# Altium footprint library hphonglib.PcbLib: 1250 footprints (part 20 of 79)
Each footprint in its own frame and in the unit in brackets; x right, y up, seen from the top. Pads: shape width x height; smd on the part's side, far side on the other; paste and mask are expansions set on the pad; w line width, h text height; cw(c..) or ccw(c..) is an arc to the next point about the centre after c.
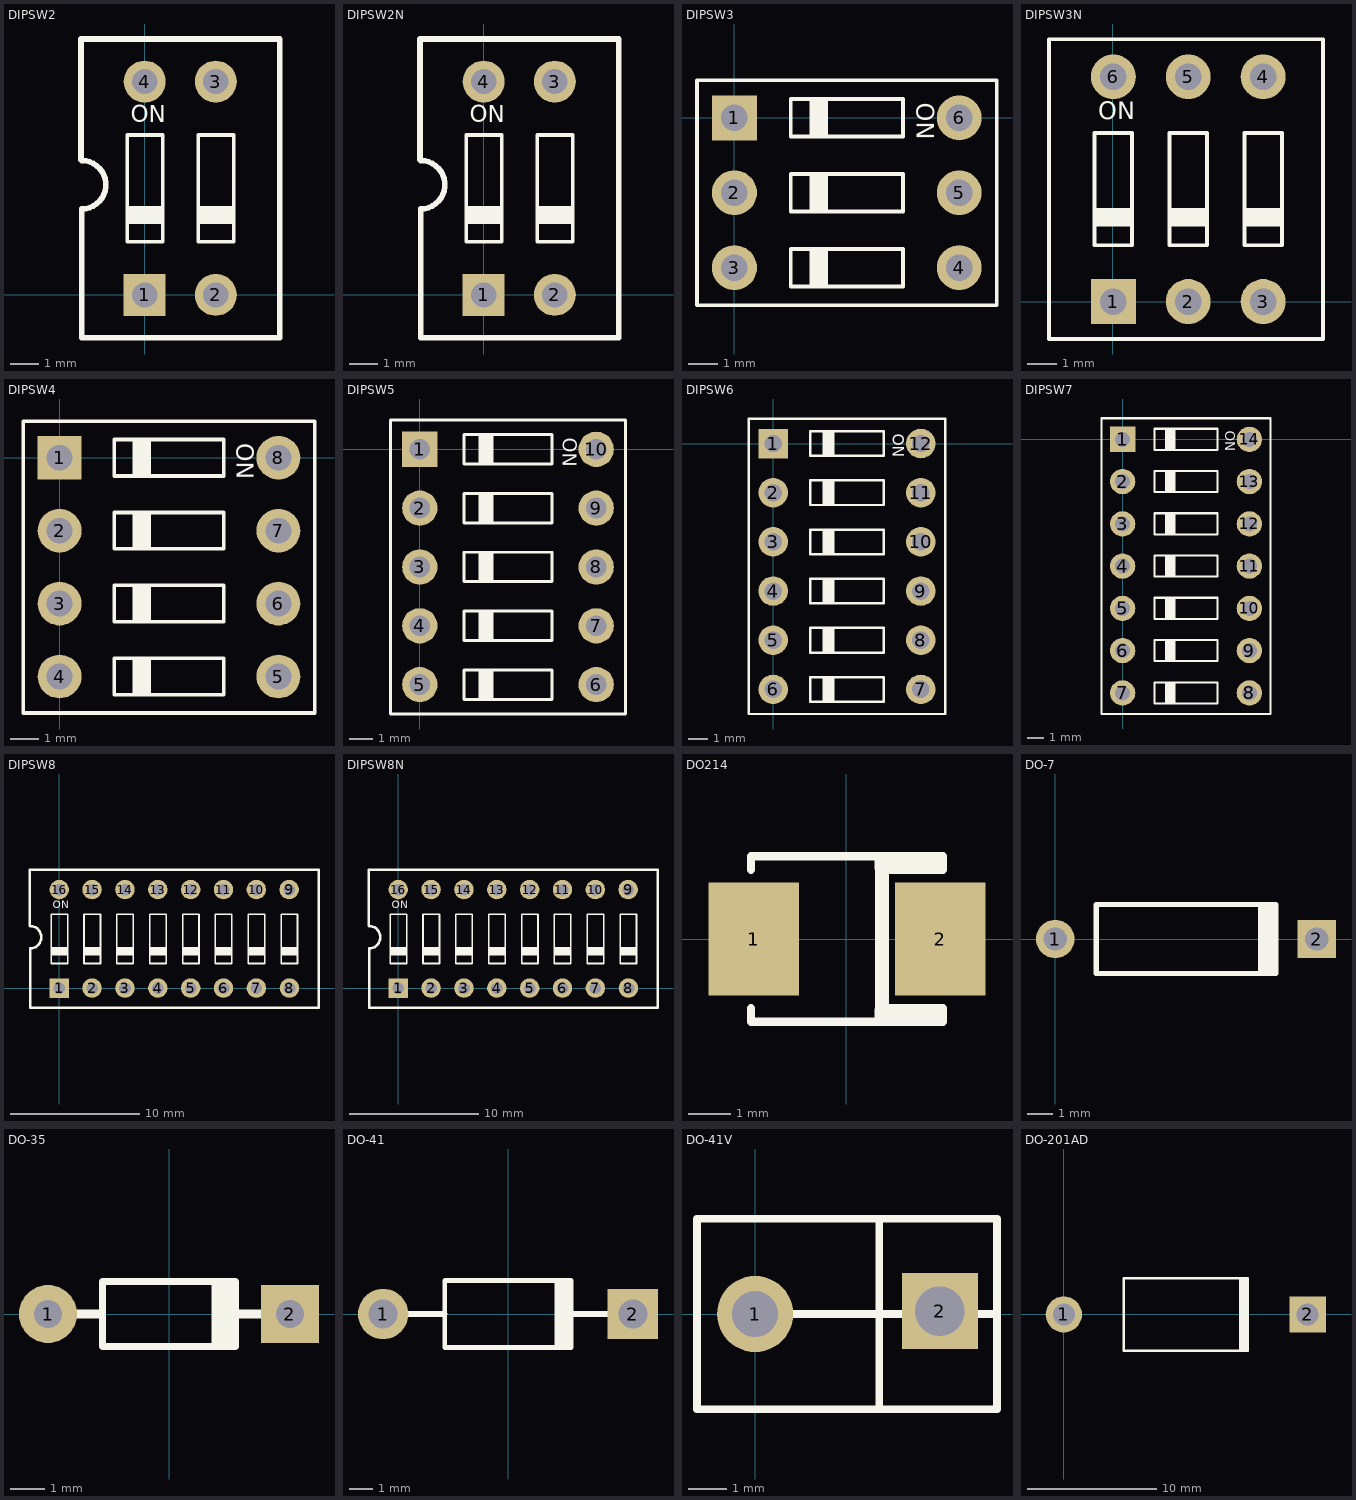
[diagram p19: the footprints below, top view; thin cyan lines are the x and y axes]

## DIPSW2 [mm]
pads (4):
  rect 1.5x1.5 hole 0.9: 1(0,0)
  round 1.5 hole 0.9: 2(2.54,0) 3(2.54,7.62) 4(0,7.62)
Top Overlay:
  region: 3.186,2.539 3.186,3.174 1.916,3.174 1.916,2.539
  region: 0.646,2.539 0.646,3.174 -0.624,3.174 -0.624,2.539
  lines w0.127: -0.624,1.904 -0.624,5.714 0.646,5.714 0.646,1.904 -0.624,1.904 ; 1.916,1.904 1.916,5.714 3.186,5.714 3.186,1.904 1.916,1.904
  lines w0.2: -2.275,4.825 -2.275,9.143 4.829,9.143 4.829,-1.525 -2.249,-1.525 -2.249,3.072 ccw(c-2.249,3.936) -2.249,4.799
  text "ON" at -0.497,5.968 h1.02
Bottom Overlay:
  lines w0.254: -2.275,-1.575 -2.275,9.125 4.85,9.125 4.85,-1.575 -2.275,-1.575
3D body: height 3.2, standoff 0.03, extent -0.311,7.314 0.299,7.924
3D body: height 3.2, standoff 0.03, extent 2.229,7.314 2.839,7.924
3D body: height 3.2, standoff 0.03, extent 2.229,-0.306 2.839,0.304
3D body: height 3.2, standoff 0.03, extent -0.285,-0.306 0.324,0.304
3D body: height 5.9, standoff 0.01, extent -2.021,-1.271 4.557,8.889
3D body: height 7.11, standoff 0.03, extent -0.497,4.063 0.519,6.095
3D body: height 6.48, standoff 0.03, extent -0.497,1.523 0.519,4.063
3D body: height 6.48, standoff 0.03, extent 2.043,3.555 3.059,6.095
3D body: height 7.11, standoff 0.03, extent 2.043,1.523 3.059,3.555

## DIPSW2N [mm]
pads (4):
  rect 1.5x1.5 hole 0.9: 1(0,0)
  round 1.5 hole 0.9: 2(2.54,0) 3(2.54,7.62) 4(0,7.62)
Top Overlay:
  region: 0.646,2.539 0.646,3.174 -0.624,3.174 -0.624,2.539
  region: 3.186,2.539 3.186,3.174 1.916,3.174 1.916,2.539
  lines w0.127: -0.624,1.904 0.646,1.904 0.646,5.714 -0.624,5.714 -0.624,1.904 ; 1.916,1.904 3.186,1.904 3.186,5.714 1.916,5.714 1.916,1.904
  lines w0.2: -2.275,4.825 -2.275,9.143 4.829,9.143 4.829,-1.525 -2.249,-1.525 -2.249,3.072 ccw(c-2.249,3.936) -2.249,4.799
  text "ON" at -0.497,5.968 h1.02
Bottom Overlay:
  lines w0.254: -2.275,-1.575 4.85,-1.575 4.85,9.125 -2.275,9.125 -2.275,-1.575

## DIPSW3 [mil]
pads (6):
  rect 60x60 hole 35.43 unplated: 1(0,0)
  round 60 hole 35.43 unplated: 2(0,-100) 3(0,-200) 4(300,-200) 5(300,-100) 6(300,0)
Top Overlay:
  rectangle: 100,-25 125,25
  rectangle: 100,-125 125,-75
  rectangle: 100,-225 125,-175
  lines w5: -50,-250 350,-250 350,50 -50,50 -50,-250 ; 75,-225 75,-175 225,-175 225,-225 75,-225 ; 75,-125 75,-75 225,-75 225,-125 75,-125 ; 75,-25 75,25 225,25 225,-25 75,-25
  text "ON" at 235,20 h40
Bottom Overlay:
  lines w10: -49.21,-249.02 -49.21,50.2 350.39,50.2 350.39,-249.02 -49.21,-249.02

## DIPSW3N [mil]
pads (6):
  rect 60x60 hole 35.43 unplated: 1(1,0)
  round 60 hole 35.43 unplated: 2(101,0) 3(201,0) 4(201,300) 5(101,300) 6(1,300)
Top Overlay:
  region: 26,100 26,125 -24,125 -24,100
  region: 126,100 126,125 76,125 76,100
  region: 226,100 226,125 176,125 176,100
  lines w5: -85,-50 -85,350 281,350 281,-50 -85,-50 ; -24,75 26,75 26,225 -24,225 -24,75 ; 76,75 126,75 126,225 76,225 76,75 ; 176,75 226,75 226,225 176,225 176,75
  text "ON" at -19,235 h40
Bottom Overlay:
  lines w10: -86,-49.21 282,-49.21 282,350.39 -86,350.39 -86,-49.21
3D body "DIPSWITCH.STEP": height 271.65, standoff -125.98, extent -79.92,-49 279.92,351

## DIPSW4 [mil]
pads (8):
  rect 60x60 hole 35.43 unplated: 1(0,0)
  round 60 hole 35.43 unplated: 2(0,-100) 3(0,-200) 4(0,-300) 5(300,-300) 6(300,-200) 7(300,-100) 8(300,0)
Top Overlay:
  rectangle: 100,-325 125,-275
  rectangle: 100,-225 125,-175
  rectangle: 100,-125 125,-75
  rectangle: 100,-25 125,25
  lines w5: -50,-350 -50,50 350,50 350,-350 -50,-350 ; 75,-325 225,-325 225,-275 75,-275 75,-325 ; 75,-225 225,-225 225,-175 75,-175 75,-225 ; 75,-125 225,-125 225,-75 75,-75 75,-125 ; 75,-25 225,-25 225,25 75,25 75,-25
  text "ON" at 235,20 h40
Bottom Overlay:
  lines w10: -48.23,-351.38 349.41,-351.38 349.41,49.21 -48.23,49.21 -48.23,-351.38
3D body "DIPSWITCH4.STEP": height 271.65, standoff -125.98, extent -15.92,-352 343.92,48

## DIPSW5 [mil]
pads (10):
  rect 60x60 hole 35.43 unplated: 1(0,0)
  round 60 hole 35.43 unplated: 2(0,-100) 3(0,-200) 4(0,-300) 5(0,-400) 6(300,-400) 7(300,-300) 8(300,-200) 9(300,-100) 10(300,0)
Top Overlay:
  rectangle: 100,-25 125,25
  rectangle: 100,-125 125,-75
  rectangle: 100,-225 125,-175
  rectangle: 100,-325 125,-275
  rectangle: 100,-425 125,-375
  lines w5: -50,-450 350,-450 350,50 -50,50 -50,-450 ; 75,-425 75,-375 225,-375 225,-425 75,-425 ; 75,-325 75,-275 225,-275 225,-325 75,-325 ; 75,-225 75,-175 225,-175 225,-225 75,-225 ; 75,-125 75,-75 225,-75 225,-125 75,-125 ; 75,-25 75,25 225,25 225,-25 75,-25
  text "ON" at 235,20 h40

## DIPSW6 [mil]
pads (12):
  rect 60x60 hole 35.43 unplated: 1(0,0)
  round 60 hole 35.43 unplated: 2(0,-100) 3(0,-200) 4(0,-300) 5(0,-400) 6(0,-500) 7(300,-500) 8(300,-400) 9(300,-300) 10(300,-200) 11(300,-100) 12(300,0)
Top Overlay:
  rectangle: 100,-525 125,-475
  rectangle: 100,-425 125,-375
  rectangle: 100,-325 125,-275
  rectangle: 100,-225 125,-175
  rectangle: 100,-125 125,-75
  rectangle: 100,-25 125,25
  lines w5: -50,-550 -50,50 350,50 350,-550 -50,-550 ; 75,-525 225,-525 225,-475 75,-475 75,-525 ; 75,-425 225,-425 225,-375 75,-375 75,-425 ; 75,-325 225,-325 225,-275 75,-275 75,-325 ; 75,-225 225,-225 225,-175 75,-175 75,-225 ; 75,-125 225,-125 225,-75 75,-75 75,-125 ; 75,-25 225,-25 225,25 75,25 75,-25
  text "ON" at 235,20 h40

## DIPSW7 [mil]
pads (14):
  rect 60x60 hole 35.43 unplated: 1(0,0)
  round 60 hole 35.43 unplated: 2(0,-100) 3(0,-200) 4(0,-300) 5(0,-400) 6(0,-500) 7(0,-600) 8(300,-600) 9(300,-500) 10(300,-400) 11(300,-300) 12(300,-200) 13(300,-100) 14(300,0)
Top Overlay:
  rectangle: 100,-25 125,25
  rectangle: 100,-125 125,-75
  rectangle: 100,-225 125,-175
  rectangle: 100,-325 125,-275
  rectangle: 100,-425 125,-375
  rectangle: 100,-525 125,-475
  rectangle: 100,-625 125,-575
  lines w5: -50,-650 350,-650 350,50 -50,50 -50,-650 ; 75,-625 75,-575 225,-575 225,-625 75,-625 ; 75,-525 75,-475 225,-475 225,-525 75,-525 ; 75,-425 75,-375 225,-375 225,-425 75,-425 ; 75,-325 75,-275 225,-275 225,-325 75,-325 ; 75,-225 75,-175 225,-175 225,-225 75,-225 ; 75,-125 75,-75 225,-75 225,-125 75,-125 ; 75,-25 75,25 225,25 225,-25 75,-25
  text "ON" at 235,20 h40

## DIPSW8 [mm] "DIPS SWITCHES 8"
pads (16):
  rect 1.5x1.5 hole 0.9: 1(-0.011,0.001)
  round 1.5 hole 0.9: 2(2.529,0.001) 3(5.069,0.001) 4(7.609,0.001) 5(10.149,0.001) 6(12.689,0.001) 7(15.229,0.001) 8(17.789,0.001) 9(17.769,7.621) 10(15.229,7.621) 11(12.689,7.621) 12(10.149,7.621) 13(7.609,7.621) 14(5.069,7.621) 15(2.529,7.621) 16(-0.011,7.621)
Top Overlay:
  region: 18.415,2.54 18.415,3.175 17.145,3.175 17.145,2.54
  region: 15.875,2.54 15.875,3.175 14.605,3.175 14.605,2.54
  region: 13.335,2.54 13.335,3.175 12.065,3.175 12.065,2.54
  region: 10.795,2.54 10.795,3.175 9.525,3.175 9.525,2.54
  region: 8.255,2.54 8.255,3.175 6.985,3.175 6.985,2.54
  region: 5.715,2.54 5.715,3.175 4.445,3.175 4.445,2.54
  region: 3.175,2.54 3.175,3.175 1.905,3.175 1.905,2.54
  region: 0.635,2.54 0.635,3.175 -0.635,3.175 -0.635,2.54
  lines w0.127: -0.635,1.905 -0.635,5.715 0.635,5.715 0.635,1.905 -0.635,1.905 ; 1.905,1.905 1.905,5.715 3.175,5.715 3.175,1.905 1.905,1.905 ; 4.445,1.905 4.445,5.715 5.715,5.715 5.715,1.905 4.445,1.905 ; 6.985,1.905 6.985,5.715 8.255,5.715 8.255,1.905 6.985,1.905 ; 9.525,1.905 9.525,5.715 10.795,5.715 10.795,1.905 9.525,1.905 ; 12.065,1.905 12.065,5.715 13.335,5.715 13.335,1.905 12.065,1.905 ; 14.605,1.905 14.605,5.715 15.875,5.715 15.875,1.905 14.605,1.905 ; 17.145,1.905 17.145,5.715 18.415,5.715 18.415,1.905 17.145,1.905
  lines w0.2: -2.286,4.826 -2.286,9.144 20.066,9.144 20.066,-1.524 -2.261,-1.524 -2.261,3.073 ccw(c-2.261,3.937) -2.261,4.801
  text "ON" at -0.508,5.969 h1.02
Bottom Overlay:
  lines w0.254: -2.2,-1.55 20.075,-1.55 20.075,9.15 -2.2,9.15 -2.2,-1.55
3D body: height 3.2, standoff 0.03, extent -0.322,7.316 0.288,7.925
3D body: height 3.2, standoff 0.03, extent 2.218,7.316 2.828,7.925
3D body: height 3.2, standoff 0.03, extent 4.758,7.316 5.368,7.925
3D body: height 3.2, standoff 0.03, extent 7.298,7.316 7.908,7.925
3D body: height 3.2, standoff 0.03, extent 9.838,7.316 10.448,7.925
3D body: height 3.2, standoff 0.03, extent 12.378,7.316 12.988,7.925
3D body: height 3.2, standoff 0.03, extent 14.918,7.316 15.528,7.925
3D body: height 3.2, standoff 0.03, extent 17.458,7.316 18.068,7.925
3D body: height 3.2, standoff 0.03, extent 17.484,-0.304 18.093,0.305
3D body: height 3.2, standoff 0.03, extent 14.918,-0.304 15.528,0.305
3D body: height 3.2, standoff 0.03, extent 12.378,-0.304 12.988,0.305
3D body: height 3.2, standoff 0.03, extent 9.838,-0.304 10.448,0.305
3D body: height 3.2, standoff 0.03, extent 7.298,-0.304 7.908,0.305
3D body: height 3.2, standoff 0.03, extent 4.758,-0.304 5.368,0.305
3D body: height 3.2, standoff 0.03, extent 2.218,-0.304 2.828,0.305
3D body: height 3.2, standoff 0.03, extent -0.296,-0.304 0.313,0.305
3D body: height 5.9, standoff 0.01, extent -2.032,-1.27 19.812,8.89
3D body: height 7.11, standoff 0.03, extent -0.508,4.064 0.508,6.096
3D body: height 6.48, standoff 0.03, extent -0.508,1.524 0.508,4.064
3D body: height 6.48, standoff 0.03, extent 4.572,1.524 5.588,4.064
3D body: height 7.11, standoff 0.03, extent 4.572,4.064 5.588,6.096
3D body: height 6.48, standoff 0.03, extent 7.112,1.524 8.128,4.064
3D body: height 7.11, standoff 0.03, extent 7.112,4.064 8.128,6.096
3D body: height 6.48, standoff 0.03, extent 14.732,1.524 15.748,4.064
3D body: height 7.11, standoff 0.03, extent 14.732,4.064 15.748,6.096
3D body: height 6.48, standoff 0.03, extent 2.032,3.556 3.048,6.096
3D body: height 7.11, standoff 0.03, extent 2.032,1.524 3.048,3.556
3D body: height 6.48, standoff 0.03, extent 9.652,3.556 10.668,6.096
3D body: height 7.11, standoff 0.03, extent 9.652,1.524 10.668,3.556
3D body: height 6.48, standoff 0.03, extent 12.192,3.556 13.208,6.096
3D body: height 7.11, standoff 0.03, extent 12.192,1.524 13.208,3.556
3D body: height 6.48, standoff 0.03, extent 17.272,3.556 18.288,6.096
3D body: height 7.11, standoff 0.03, extent 17.272,1.524 18.288,3.556

## DIPSW8N [mm] "DIPS SWITCHES 8"
pads (16):
  rect 1.5x1.5 hole 0.9: 1(-0.011,0.001)
  round 1.5 hole 0.9: 2(2.529,0.001) 3(5.069,0.001) 4(7.609,0.001) 5(10.149,0.001) 6(12.689,0.001) 7(15.229,0.001) 8(17.789,0.001) 9(17.769,7.621) 10(15.229,7.621) 11(12.689,7.621) 12(10.149,7.621) 13(7.609,7.621) 14(5.069,7.621) 15(2.529,7.621) 16(-0.011,7.621)
Top Overlay:
  region: 18.415,2.54 18.415,3.175 17.145,3.175 17.145,2.54
  region: 15.875,2.54 15.875,3.175 14.605,3.175 14.605,2.54
  region: 13.335,2.54 13.335,3.175 12.065,3.175 12.065,2.54
  region: 10.795,2.54 10.795,3.175 9.525,3.175 9.525,2.54
  region: 8.255,2.54 8.255,3.175 6.985,3.175 6.985,2.54
  region: 5.715,2.54 5.715,3.175 4.445,3.175 4.445,2.54
  region: 3.175,2.54 3.175,3.175 1.905,3.175 1.905,2.54
  region: 0.635,2.54 0.635,3.175 -0.635,3.175 -0.635,2.54
  lines w0.127: -0.635,1.905 -0.635,5.715 0.635,5.715 0.635,1.905 -0.635,1.905 ; 1.905,1.905 1.905,5.715 3.175,5.715 3.175,1.905 1.905,1.905 ; 4.445,1.905 4.445,5.715 5.715,5.715 5.715,1.905 4.445,1.905 ; 6.985,1.905 6.985,5.715 8.255,5.715 8.255,1.905 6.985,1.905 ; 9.525,1.905 9.525,5.715 10.795,5.715 10.795,1.905 9.525,1.905 ; 12.065,1.905 12.065,5.715 13.335,5.715 13.335,1.905 12.065,1.905 ; 14.605,1.905 14.605,5.715 15.875,5.715 15.875,1.905 14.605,1.905 ; 17.145,1.905 17.145,5.715 18.415,5.715 18.415,1.905 17.145,1.905
  lines w0.2: -2.286,4.826 -2.286,9.144 20.066,9.144 20.066,-1.524 -2.261,-1.524 -2.261,3.073 ccw(c-2.261,3.937) -2.261,4.801
  text "ON" at -0.508,5.969 h1.02
Bottom Overlay:
  lines w0.254: -2.2,-1.55 20.075,-1.55 20.075,9.15 -2.2,9.15 -2.2,-1.55
3D body "DIPSWITCH8.STEP": height 6.9, standoff -3.2, extent -2.009,-1.245 19.891,8.915

## DO214 [mm]
pads (2):
  rect 2.159x2.7 smd: 1(-2.21,0.005) 2(2.235,0.005)
Top Overlay:
  rectangle: 0.673,1.657 2.298,1.974
  rectangle: 0.673,-1.962 2.298,-1.645
  rectangle: 0.677,-1.648 1.007,1.654
  lines w0.2: -2.274,-1.646 -2.274,-1.964 2.298,-1.964 2.298,-1.646 0.774,-1.646 ; -2.274,1.656 -2.274,1.973 2.298,1.973 2.298,1.656 0.774,1.656
3D body: height 1.27, standoff 0, extent -3.175,-1.27 3.175,1.27

## DO-7 [mm] "Diode, Axial; Body 7 x 2.7 mm (LxDia. max), Lead Dia. 0.53 mm (max)"
height 2.7
pads (2):
  round 1.5 hole 0.9: 1(0,0)
  rect 1.5x1.5 hole 0.9: 2(10.2,0)
Top Overlay:
  rectangle: 7.9,-1.35 8.7,1.35
  lines w0.2: 8.6,-1.35 1.6,-1.35 1.6,1.35 8.6,1.35

## DO-35 [mil] "Diode, Axial; Body 3.8 x 1.9 mm (LxDia. max), Lead Dia. 0.53 mm (max); Solder Pad 35mil"
height 74.8
pads (2):
  round 67 hole 32: 1(-139.76,0)
  rect 67x67 hole 32: 2(139.76,0)
Top Overlay:
  rectangle: 49.21,-37.4 80.71,37.4
  lines w7.87: 76.77,-37.4 -76.77,-37.4 -76.77,37.4 76.77,37.4
  lines w10: -140,0 -80,0 ; 80,0 140,0
3D body "User Library-1n4148-1.STEP": height 89.37, standoff -166.54, extent -147.64,-40.01 147.63,38.73

## DO-41 [mil] "Diode, Axial; Body 5.2 x 2.7 mm (LxDia. max), Lead Dia. 0.86 mm (max); Solder Pad 35mil"
height 110.24
pads (2):
  round 83 hole 48: 1(-205.91,0)
  rect 83x83 hole 48: 2(205.91,0)
Top Overlay:
  rectangle: 76.77,-55.12 108.27,55.12
  lines w7.87: 104.33,-55.12 -104.33,-55.12 -104.33,55.12 104.33,55.12
  lines w10: -205,0 -105,0 ; 105,0 205,0
3D body "User Library-1n4007-1.STEP": height 104.21, standoff -161.54, extent -228.35,-49.21 228.35,49.21

## DO-41V [mm]
pads (2):
  round 2 hole 1.2: 1(0,0)
  rect 2x2 hole 1.3: 2(4.851,0.076)
Top Overlay:
  lines w0.2: 0.225,0 2.8,0 ; 1.2,0 6.35,0 ; 3.258,-2.5 3.258,2.5 ; 6.35,0 6.35,-2.5 -1.524,-2.5 -1.524,2.5 6.35,2.5 6.35,0
3D body "User Library-DO-201AV-Vertical_200.STEP": height 15.69, standoff -3, extent -2.848,-2.857 5.692,2.743

## DO-201AD [mm] "Diode FR30x, Axial; Body 9.5 x 5.6 mm (LxDia. max), Lead Dia. 1.32 mm (max)"
height 5.6
pads (2):
  round 2.8 hole 1.7: 1(0,0)
  rect 2.8x2.8 hole 1.7: 2(18.84,0)
Top Overlay:
  rectangle: 13.52,-2.8 14.32,2.8
  lines w0.2: 14.22,-2.8 4.62,-2.8 4.62,2.8 14.22,2.8
Bottom Overlay:
  lines w0.254: -2.15,-3.025 -2.15,3.1 21.025,3.1 21.025,-3.025 -2,-3.025 -2.15,-3.025
3D body: height 5.79, standoff 0.19, extent 12.625,-2.804 14.625,2.804
3D body: height 3.6, standoff 2.4, extent -0.275,-0.598 4.225,0.6
3D body: height 3.6, standoff 2.4, extent 14.525,-0.6 19.025,0.598
3D body: height 3.1, standoff -1, extent 18.25,-0.649 19.445,0.548
3D body: height 3.1, standoff -1, extent -0.623,-0.598 0.573,0.6
3D body: height 5.78, standoff 0.2, extent 4.2,-2.8 14.2,2.789